# Altium footprint library ref-packages-longpad.PCBLIB: 1527 footprints (part 73 of 103)
Each footprint in its own frame and in the unit in brackets; x right, y up, seen from the top. Pads: shape width x height; smd on the part's side, far side on the other; paste and mask are expansions set on the pad; w line width, h text height; cw(c..) or ccw(c..) is an arc to the next point about the centre after c.
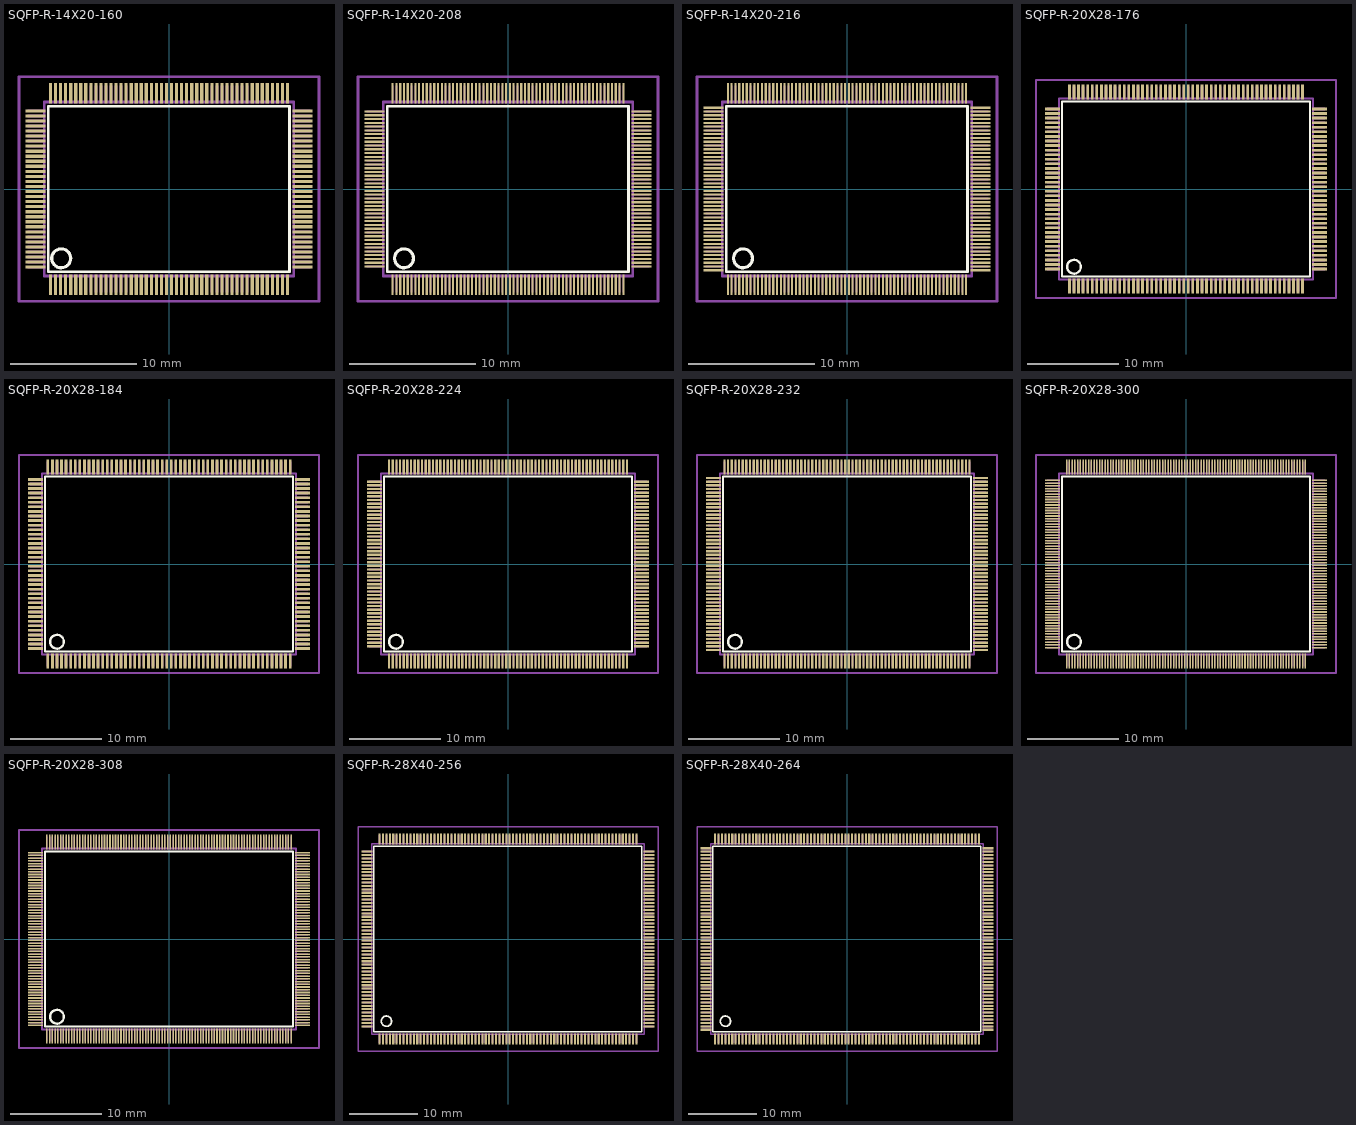
[diagram p72: the footprints below, top view; thin cyan lines are the x and y axes]

## SQFP-R-14X20-160 [mm]
pads (160):
  rect 0.25x1.6 smd: 1(-9.4,-7.6) 2(-9,-7.6) 3(-8.6,-7.6) 4(-8.2,-7.6) 5(-7.8,-7.6) 6(-7.4,-7.6) 7(-7,-7.6) 8(-6.6,-7.6) 9(-6.2,-7.6) 10(-5.8,-7.6) 11(-5.4,-7.6) 12(-5,-7.6) 13(-4.6,-7.6) 14(-4.2,-7.6) 15(-3.8,-7.6) 16(-3.4,-7.6) 17(-3,-7.6) 18(-2.6,-7.6) 19(-2.2,-7.6) 20(-1.8,-7.6) 21(-1.4,-7.6) 22(-1,-7.6) 23(-0.6,-7.6) 24(-0.2,-7.6) 25(0.2,-7.6) 26(0.6,-7.6) 27(1,-7.6) 28(1.4,-7.6) 29(1.8,-7.6) 30(2.2,-7.6) 31(2.6,-7.6) 32(3,-7.6) 33(3.4,-7.6) 34(3.8,-7.6) 35(4.2,-7.6) 36(4.6,-7.6) 37(5,-7.6) 38(5.4,-7.6) 39(5.8,-7.6) 40(6.2,-7.6) 41(6.6,-7.6) 42(7,-7.6) 43(7.4,-7.6) 44(7.8,-7.6) 45(8.2,-7.6) 46(8.6,-7.6) 47(9,-7.6) 48(9.4,-7.6) 81(9.4,7.6) 82(9,7.6) 83(8.6,7.6) 84(8.2,7.6) 85(7.8,7.6) 86(7.4,7.6) 87(7,7.6) 88(6.6,7.6) 89(6.2,7.6) 90(5.8,7.6) 91(5.4,7.6) 92(5,7.6) 93(4.6,7.6) 94(4.2,7.6) 95(3.8,7.6) 96(3.4,7.6) 97(3,7.6) 98(2.6,7.6) 99(2.2,7.6) 100(1.8,7.6) 101(1.4,7.6) 102(1,7.6) 103(0.6,7.6) 104(0.2,7.6) 105(-0.2,7.6) 106(-0.6,7.6) 107(-1,7.6) 108(-1.4,7.6) 109(-1.8,7.6) 110(-2.2,7.6) 111(-2.6,7.6) 112(-3,7.6) 113(-3.4,7.6) 114(-3.8,7.6) 115(-4.2,7.6) 116(-4.6,7.6) 117(-5,7.6) 118(-5.4,7.6) 119(-5.8,7.6) 120(-6.2,7.6) 121(-6.6,7.6) 122(-7,7.6) 123(-7.4,7.6) 124(-7.8,7.6) 125(-8.2,7.6) 126(-8.6,7.6) 127(-9,7.6) 128(-9.4,7.6)
  rect 1.6x0.25 smd: 49(10.6,-6.2) 50(10.6,-5.8) 51(10.6,-5.4) 52(10.6,-5) 53(10.6,-4.6) 54(10.6,-4.2) 55(10.6,-3.8) 56(10.6,-3.4) 57(10.6,-3) 58(10.6,-2.6) 59(10.6,-2.2) 60(10.6,-1.8) 61(10.6,-1.4) 62(10.6,-1) 63(10.6,-0.6) 64(10.6,-0.2) 65(10.6,0.2) 66(10.6,0.6) 67(10.6,1) 68(10.6,1.4) 69(10.6,1.8) 70(10.6,2.2) 71(10.6,2.6) 72(10.6,3) 73(10.6,3.4) 74(10.6,3.8) 75(10.6,4.2) 76(10.6,4.6) 77(10.6,5) 78(10.6,5.4) 79(10.6,5.8) 80(10.6,6.2) 129(-10.6,6.2) 130(-10.6,5.8) 131(-10.6,5.4) 132(-10.6,5) 133(-10.6,4.6) 134(-10.6,4.2) 135(-10.6,3.8) 136(-10.6,3.4) 137(-10.6,3) 138(-10.6,2.6) 139(-10.6,2.2) 140(-10.6,1.8) 141(-10.6,1.4) 142(-10.6,1) 143(-10.6,0.6) 144(-10.6,0.2) 145(-10.6,-0.2) 146(-10.6,-0.6) 147(-10.6,-1) 148(-10.6,-1.4) 149(-10.6,-1.8) 150(-10.6,-2.2) 151(-10.6,-2.6) 152(-10.6,-3) 153(-10.6,-3.4) 154(-10.6,-3.8) 155(-10.6,-4.2) 156(-10.6,-4.6) 157(-10.6,-5) 158(-10.6,-5.4) 159(-10.6,-5.8) 160(-10.6,-6.2)
Top Overlay:
  circle w0.254: c-8.55,-5.5 r0.75
  lines w0.203: -9.57,-6.56 9.56,-6.56 9.56,6.56 -9.57,6.56 -9.57,-6.56
Mechanical 16:
  drawing of 164 lines, arcs and shapes, not listed
Mechanical 27:
  lines w0.2: -11.9,-8.9 -11.9,8.9 11.9,8.9 11.9,-8.9 -11.9,-8.9

## SQFP-R-14X20-208 [mm]
pads (208):
  rect 0.17x1.6 smd: 1(-9.15,-7.6) 2(-8.85,-7.6) 3(-8.55,-7.6) 4(-8.25,-7.6) 5(-7.95,-7.6) 6(-7.65,-7.6) 7(-7.35,-7.6) 8(-7.05,-7.6) 9(-6.75,-7.6) 10(-6.45,-7.6) 11(-6.15,-7.6) 12(-5.85,-7.6) 13(-5.55,-7.6) 14(-5.25,-7.6) 15(-4.95,-7.6) 16(-4.65,-7.6) 17(-4.35,-7.6) 18(-4.05,-7.6) 19(-3.75,-7.6) 20(-3.45,-7.6) 21(-3.15,-7.6) 22(-2.85,-7.6) 23(-2.55,-7.6) 24(-2.25,-7.6) 25(-1.95,-7.6) 26(-1.65,-7.6) 27(-1.35,-7.6) 28(-1.05,-7.6) 29(-0.75,-7.6) 30(-0.45,-7.6) 31(-0.15,-7.6) 32(0.15,-7.6) 33(0.45,-7.6) 34(0.75,-7.6) 35(1.05,-7.6) 36(1.35,-7.6) 37(1.65,-7.6) 38(1.95,-7.6) 39(2.25,-7.6) 40(2.55,-7.6) 41(2.85,-7.6) 42(3.15,-7.6) 43(3.45,-7.6) 44(3.75,-7.6) 45(4.05,-7.6) 46(4.35,-7.6) 47(4.65,-7.6) 48(4.95,-7.6) 49(5.25,-7.6) 50(5.55,-7.6) 51(5.85,-7.6) 52(6.15,-7.6) 53(6.45,-7.6) 54(6.75,-7.6) 55(7.05,-7.6) 56(7.35,-7.6) 57(7.65,-7.6) 58(7.95,-7.6) 59(8.25,-7.6) 60(8.55,-7.6) 61(8.85,-7.6) 62(9.15,-7.6) 105(9.15,7.6) 106(8.85,7.6) 107(8.55,7.6) 108(8.25,7.6) 109(7.95,7.6) 110(7.65,7.6) 111(7.35,7.6) 112(7.05,7.6) 113(6.75,7.6) 114(6.45,7.6) 115(6.15,7.6) 116(5.85,7.6) 117(5.55,7.6) 118(5.25,7.6) 119(4.95,7.6) 120(4.65,7.6) 121(4.35,7.6) 122(4.05,7.6) 123(3.75,7.6) 124(3.45,7.6) 125(3.15,7.6) 126(2.85,7.6) 127(2.55,7.6) 128(2.25,7.6) 129(1.95,7.6) 130(1.65,7.6) 131(1.35,7.6) 132(1.05,7.6) 133(0.75,7.6) 134(0.45,7.6) 135(0.15,7.6) 136(-0.15,7.6) 137(-0.45,7.6) 138(-0.75,7.6) 139(-1.05,7.6) 140(-1.35,7.6) 141(-1.65,7.6) 142(-1.95,7.6) 143(-2.25,7.6) 144(-2.55,7.6) 145(-2.85,7.6) 146(-3.15,7.6) 147(-3.45,7.6) 148(-3.75,7.6) 149(-4.05,7.6) 150(-4.35,7.6) 151(-4.65,7.6) 152(-4.95,7.6) 153(-5.25,7.6) 154(-5.55,7.6) 155(-5.85,7.6) 156(-6.15,7.6) 157(-6.45,7.6) 158(-6.75,7.6) 159(-7.05,7.6) 160(-7.35,7.6) 161(-7.65,7.6) 162(-7.95,7.6) 163(-8.25,7.6) 164(-8.55,7.6) 165(-8.85,7.6) 166(-9.15,7.6)
  rect 1.6x0.17 smd: 63(10.6,-6.15) 64(10.6,-5.85) 65(10.6,-5.55) 66(10.6,-5.25) 67(10.6,-4.95) 68(10.6,-4.65) 69(10.6,-4.35) 70(10.6,-4.05) 71(10.6,-3.75) 72(10.6,-3.45) 73(10.6,-3.15) 74(10.6,-2.85) 75(10.6,-2.55) 76(10.6,-2.25) 77(10.6,-1.95) 78(10.6,-1.65) 79(10.6,-1.35) 80(10.6,-1.05) 81(10.6,-0.75) 82(10.6,-0.45) 83(10.6,-0.15) 84(10.6,0.15) 85(10.6,0.45) 86(10.6,0.75) 87(10.6,1.05) 88(10.6,1.35) 89(10.6,1.65) 90(10.6,1.95) 91(10.6,2.25) 92(10.6,2.55) 93(10.6,2.85) 94(10.6,3.15) 95(10.6,3.45) 96(10.6,3.75) 97(10.6,4.05) 98(10.6,4.35) 99(10.6,4.65) 100(10.6,4.95) 101(10.6,5.25) 102(10.6,5.55) 103(10.6,5.85) 104(10.6,6.15) 167(-10.6,6.15) 168(-10.6,5.85) 169(-10.6,5.55) 170(-10.6,5.25) 171(-10.6,4.95) 172(-10.6,4.65) 173(-10.6,4.35) 174(-10.6,4.05) 175(-10.6,3.75) 176(-10.6,3.45) 177(-10.6,3.15) 178(-10.6,2.85) 179(-10.6,2.55) 180(-10.6,2.25) 181(-10.6,1.95) 182(-10.6,1.65) 183(-10.6,1.35) 184(-10.6,1.05) 185(-10.6,0.75) 186(-10.6,0.45) 187(-10.6,0.15) 188(-10.6,-0.15) 189(-10.6,-0.45) 190(-10.6,-0.75) 191(-10.6,-1.05) 192(-10.6,-1.35) 193(-10.6,-1.65) 194(-10.6,-1.95) 195(-10.6,-2.25) 196(-10.6,-2.55) 197(-10.6,-2.85) 198(-10.6,-3.15) 199(-10.6,-3.45) 200(-10.6,-3.75) 201(-10.6,-4.05) 202(-10.6,-4.35) 203(-10.6,-4.65) 204(-10.6,-4.95) 205(-10.6,-5.25) 206(-10.6,-5.55) 207(-10.6,-5.85) 208(-10.6,-6.15)
Top Overlay:
  circle w0.254: c-8.25,-5.5 r0.75
  lines w0.203: -9.57,-6.56 9.56,-6.56 9.56,6.56 -9.57,6.56 -9.57,-6.56
Mechanical 16:
  drawing of 212 lines, arcs and shapes, not listed
Mechanical 27:
  lines w0.2: -11.9,-8.9 -11.9,8.9 11.9,8.9 11.9,-8.9 -11.9,-8.9

## SQFP-R-14X20-216 [mm]
pads (216):
  rect 0.17x1.6 smd: 1(-9.45,-7.6) 2(-9.15,-7.6) 3(-8.85,-7.6) 4(-8.55,-7.6) 5(-8.25,-7.6) 6(-7.95,-7.6) 7(-7.65,-7.6) 8(-7.35,-7.6) 9(-7.05,-7.6) 10(-6.75,-7.6) 11(-6.45,-7.6) 12(-6.15,-7.6) 13(-5.85,-7.6) 14(-5.55,-7.6) 15(-5.25,-7.6) 16(-4.95,-7.6) 17(-4.65,-7.6) 18(-4.35,-7.6) 19(-4.05,-7.6) 20(-3.75,-7.6) 21(-3.45,-7.6) 22(-3.15,-7.6) 23(-2.85,-7.6) 24(-2.55,-7.6) 25(-2.25,-7.6) 26(-1.95,-7.6) 27(-1.65,-7.6) 28(-1.35,-7.6) 29(-1.05,-7.6) 30(-0.75,-7.6) 31(-0.45,-7.6) 32(-0.15,-7.6) 33(0.15,-7.6) 34(0.45,-7.6) 35(0.75,-7.6) 36(1.05,-7.6) 37(1.35,-7.6) 38(1.65,-7.6) 39(1.95,-7.6) 40(2.25,-7.6) 41(2.55,-7.6) 42(2.85,-7.6) 43(3.15,-7.6) 44(3.45,-7.6) 45(3.75,-7.6) 46(4.05,-7.6) 47(4.35,-7.6) 48(4.65,-7.6) 49(4.95,-7.6) 50(5.25,-7.6) 51(5.55,-7.6) 52(5.85,-7.6) 53(6.15,-7.6) 54(6.45,-7.6) 55(6.75,-7.6) 56(7.05,-7.6) 57(7.35,-7.6) 58(7.65,-7.6) 59(7.95,-7.6) 60(8.25,-7.6) 61(8.55,-7.6) 62(8.85,-7.6) 63(9.15,-7.6) 64(9.45,-7.6) 109(9.45,7.6) 110(9.15,7.6) 111(8.85,7.6) 112(8.55,7.6) 113(8.25,7.6) 114(7.95,7.6) 115(7.65,7.6) 116(7.35,7.6) 117(7.05,7.6) 118(6.75,7.6) 119(6.45,7.6) 120(6.15,7.6) 121(5.85,7.6) 122(5.55,7.6) 123(5.25,7.6) 124(4.95,7.6) 125(4.65,7.6) 126(4.35,7.6) 127(4.05,7.6) 128(3.75,7.6) 129(3.45,7.6) 130(3.15,7.6) 131(2.85,7.6) 132(2.55,7.6) 133(2.25,7.6) 134(1.95,7.6) 135(1.65,7.6) 136(1.35,7.6) 137(1.05,7.6) 138(0.75,7.6) 139(0.45,7.6) 140(0.15,7.6) 141(-0.15,7.6) 142(-0.45,7.6) 143(-0.75,7.6) 144(-1.05,7.6) 145(-1.35,7.6) 146(-1.65,7.6) 147(-1.95,7.6) 148(-2.25,7.6) 149(-2.55,7.6) 150(-2.85,7.6) 151(-3.15,7.6) 152(-3.45,7.6) 153(-3.75,7.6) 154(-4.05,7.6) 155(-4.35,7.6) 156(-4.65,7.6) 157(-4.95,7.6) 158(-5.25,7.6) 159(-5.55,7.6) 160(-5.85,7.6) 161(-6.15,7.6) 162(-6.45,7.6) 163(-6.75,7.6) 164(-7.05,7.6) 165(-7.35,7.6) 166(-7.65,7.6) 167(-7.95,7.6) 168(-8.25,7.6) 169(-8.55,7.6) 170(-8.85,7.6) 171(-9.15,7.6) 172(-9.45,7.6)
  rect 1.6x0.17 smd: 65(10.6,-6.45) 66(10.6,-6.15) 67(10.6,-5.85) 68(10.6,-5.55) 69(10.6,-5.25) 70(10.6,-4.95) 71(10.6,-4.65) 72(10.6,-4.35) 73(10.6,-4.05) 74(10.6,-3.75) 75(10.6,-3.45) 76(10.6,-3.15) 77(10.6,-2.85) 78(10.6,-2.55) 79(10.6,-2.25) 80(10.6,-1.95) 81(10.6,-1.65) 82(10.6,-1.35) 83(10.6,-1.05) 84(10.6,-0.75) 85(10.6,-0.45) 86(10.6,-0.15) 87(10.6,0.15) 88(10.6,0.45) 89(10.6,0.75) 90(10.6,1.05) 91(10.6,1.35) 92(10.6,1.65) 93(10.6,1.95) 94(10.6,2.25) 95(10.6,2.55) 96(10.6,2.85) 97(10.6,3.15) 98(10.6,3.45) 99(10.6,3.75) 100(10.6,4.05) 101(10.6,4.35) 102(10.6,4.65) 103(10.6,4.95) 104(10.6,5.25) 105(10.6,5.55) 106(10.6,5.85) 107(10.6,6.15) 108(10.6,6.45) 173(-10.6,6.45) 174(-10.6,6.15) 175(-10.6,5.85) 176(-10.6,5.55) 177(-10.6,5.25) 178(-10.6,4.95) 179(-10.6,4.65) 180(-10.6,4.35) 181(-10.6,4.05) 182(-10.6,3.75) 183(-10.6,3.45) 184(-10.6,3.15) 185(-10.6,2.85) 186(-10.6,2.55) 187(-10.6,2.25) 188(-10.6,1.95) 189(-10.6,1.65) 190(-10.6,1.35) 191(-10.6,1.05) 192(-10.6,0.75) 193(-10.6,0.45) 194(-10.6,0.15) 195(-10.6,-0.15) 196(-10.6,-0.45) 197(-10.6,-0.75) 198(-10.6,-1.05) 199(-10.6,-1.35) 200(-10.6,-1.65) 201(-10.6,-1.95) 202(-10.6,-2.25) 203(-10.6,-2.55) 204(-10.6,-2.85) 205(-10.6,-3.15) 206(-10.6,-3.45) 207(-10.6,-3.75) 208(-10.6,-4.05) 209(-10.6,-4.35) 210(-10.6,-4.65) 211(-10.6,-4.95) 212(-10.6,-5.25) 213(-10.6,-5.55) 214(-10.6,-5.85) 215(-10.6,-6.15) 216(-10.6,-6.45)
Top Overlay:
  circle w0.254: c-8.25,-5.5 r0.75
  lines w0.203: -9.57,-6.56 9.56,-6.56 9.56,6.56 -9.57,6.56 -9.57,-6.56
Mechanical 16:
  drawing of 220 lines, arcs and shapes, not listed
Mechanical 27:
  lines w0.2: -11.9,-8.9 -11.9,8.9 11.9,8.9 11.9,-8.9 -11.9,-8.9

## SQFP-R-20X28-176 [mil]
pads (176):
  rect 11.81x62.99 smd: 1(-501.97,-417.32) 2(-482.28,-417.32) 3(-462.6,-417.32) 4(-442.91,-417.32) 5(-423.23,-417.32) 6(-403.54,-417.32) 7(-383.86,-417.32) 8(-364.17,-417.32) 9(-344.49,-417.32) 10(-324.8,-417.32) 11(-305.12,-417.32) 12(-285.43,-417.32) 13(-265.75,-417.32) 14(-246.06,-417.32) 15(-226.38,-417.32) 16(-206.69,-417.32) 17(-187.01,-417.32) 18(-167.32,-417.32) 19(-147.64,-417.32) 20(-127.95,-417.32) 21(-108.27,-417.32) 22(-88.58,-417.32) 23(-68.9,-417.32) 24(-49.21,-417.32) 25(-29.53,-417.32) 26(-9.84,-417.32) 27(9.84,-417.32) 28(29.53,-417.32) 29(49.21,-417.32) 30(68.9,-417.32) 31(88.58,-417.32) 32(108.27,-417.32) 33(127.95,-417.32) 34(147.64,-417.32) 35(167.32,-417.32) 36(187.01,-417.32) 37(206.69,-417.32) 38(226.38,-417.32) 39(246.06,-417.32) 40(265.75,-417.32) 41(285.43,-417.32) 42(305.12,-417.32) 43(324.8,-417.32) 44(344.49,-417.32) 45(364.17,-417.32) 46(383.86,-417.32) 47(403.54,-417.32) 48(423.23,-417.32) 49(442.91,-417.32) 50(462.6,-417.32) 51(482.28,-417.32) 52(501.97,-417.32) 89(501.97,417.32) 90(482.28,417.32) 91(462.6,417.32) 92(442.91,417.32) 93(423.23,417.32) 94(403.54,417.32) 95(383.86,417.32) 96(364.17,417.32) 97(344.49,417.32) 98(324.8,417.32) 99(305.12,417.32) 100(285.43,417.32) 101(265.75,417.32) 102(246.06,417.32) 103(226.38,417.32) 104(206.69,417.32) 105(187.01,417.32) 106(167.32,417.32) 107(147.64,417.32) 108(127.95,417.32) 109(108.27,417.32) 110(88.58,417.32) 111(68.9,417.32) 112(49.21,417.32) 113(29.53,417.32) 114(9.84,417.32) 115(-9.84,417.32) 116(-29.53,417.32) 117(-49.21,417.32) 118(-68.9,417.32) 119(-88.58,417.32) 120(-108.27,417.32) 121(-127.95,417.32) 122(-147.64,417.32) 123(-167.32,417.32) 124(-187.01,417.32) 125(-206.69,417.32) 126(-226.38,417.32) 127(-246.06,417.32) 128(-265.75,417.32) 129(-285.43,417.32) 130(-305.12,417.32) 131(-324.8,417.32) 132(-344.49,417.32) 133(-364.17,417.32) 134(-383.86,417.32) 135(-403.54,417.32) 136(-423.23,417.32) 137(-442.91,417.32) 138(-462.6,417.32) 139(-482.28,417.32) 140(-501.97,417.32)
  rect 62.99x11.81 smd: 53(574.8,-344.49) 54(574.8,-324.8) 55(574.8,-305.12) 56(574.8,-285.43) 57(574.8,-265.75) 58(574.8,-246.06) 59(574.8,-226.38) 60(574.8,-206.69) 61(574.8,-187.01) 62(574.8,-167.32) 63(574.8,-147.64) 64(574.8,-127.95) 65(574.8,-108.27) 66(574.8,-88.58) 67(574.8,-68.9) 68(574.8,-49.21) 69(574.8,-29.53) 70(574.8,-9.84) 71(574.8,9.84) 72(574.8,29.53) 73(574.8,49.21) 74(574.8,68.9) 75(574.8,88.58) 76(574.8,108.27) 77(574.8,127.95) 78(574.8,147.64) 79(574.8,167.32) 80(574.8,187.01) 81(574.8,206.69) 82(574.8,226.38) 83(574.8,246.06) 84(574.8,265.75) 85(574.8,285.43) 86(574.8,305.12) 87(574.8,324.8) 88(574.8,344.49) 141(-574.8,344.49) 142(-574.8,324.8) 143(-574.8,305.12) 144(-574.8,285.43) 145(-574.8,265.75) 146(-574.8,246.06) 147(-574.8,226.38) 148(-574.8,206.69) 149(-574.8,187.01) 150(-574.8,167.32) 151(-574.8,147.64) 152(-574.8,127.95) 153(-574.8,108.27) 154(-574.8,88.58) 155(-574.8,68.9) 156(-574.8,49.21) 157(-574.8,29.53) 158(-574.8,9.84) 159(-574.8,-9.84) 160(-574.8,-29.53) 161(-574.8,-49.21) 162(-574.8,-68.9) 163(-574.8,-88.58) 164(-574.8,-108.27) 165(-574.8,-127.95) 166(-574.8,-147.64) 167(-574.8,-167.32) 168(-574.8,-187.01) 169(-574.8,-206.69) 170(-574.8,-226.38) 171(-574.8,-246.06) 172(-574.8,-265.75) 173(-574.8,-285.43) 174(-574.8,-305.12) 175(-574.8,-324.8) 176(-574.8,-344.49)
Top Overlay:
  circle w10: c-482.28,-334.65 r29.52
  lines w8: -534.25,-376.38 533.86,-376.38 533.86,376.38 -534.25,376.38 -534.25,-376.38
Mechanical 16:
  drawing of 180 lines, arcs and shapes, not listed
Mechanical 27:
  lines w7.87: -645.67,-468.5 -645.67,468.5 645.67,468.5 645.67,-468.5 -645.67,-468.5

## SQFP-R-20X28-184 [mil]
pads (184):
  rect 11.81x62.99 smd: 1(-521.65,-417.32) 2(-501.97,-417.32) 3(-482.28,-417.32) 4(-462.6,-417.32) 5(-442.91,-417.32) 6(-423.23,-417.32) 7(-403.54,-417.32) 8(-383.86,-417.32) 9(-364.17,-417.32) 10(-344.49,-417.32) 11(-324.8,-417.32) 12(-305.12,-417.32) 13(-285.43,-417.32) 14(-265.75,-417.32) 15(-246.06,-417.32) 16(-226.38,-417.32) 17(-206.69,-417.32) 18(-187.01,-417.32) 19(-167.32,-417.32) 20(-147.64,-417.32) 21(-127.95,-417.32) 22(-108.27,-417.32) 23(-88.58,-417.32) 24(-68.9,-417.32) 25(-49.21,-417.32) 26(-29.53,-417.32) 27(-9.84,-417.32) 28(9.84,-417.32) 29(29.53,-417.32) 30(49.21,-417.32) 31(68.9,-417.32) 32(88.58,-417.32) 33(108.27,-417.32) 34(127.95,-417.32) 35(147.64,-417.32) 36(167.32,-417.32) 37(187.01,-417.32) 38(206.69,-417.32) 39(226.38,-417.32) 40(246.06,-417.32) 41(265.75,-417.32) 42(285.43,-417.32) 43(305.12,-417.32) 44(324.8,-417.32) 45(344.49,-417.32) 46(364.17,-417.32) 47(383.86,-417.32) 48(403.54,-417.32) 49(423.23,-417.32) 50(442.91,-417.32) 51(462.6,-417.32) 52(482.28,-417.32) 53(501.97,-417.32) 54(521.65,-417.32) 93(521.65,417.32) 94(501.97,417.32) 95(482.28,417.32) 96(462.6,417.32) 97(442.91,417.32) 98(423.23,417.32) 99(403.54,417.32) 100(383.86,417.32) 101(364.17,417.32) 102(344.49,417.32) 103(324.8,417.32) 104(305.12,417.32) 105(285.43,417.32) 106(265.75,417.32) 107(246.06,417.32) 108(226.38,417.32) 109(206.69,417.32) 110(187.01,417.32) 111(167.32,417.32) 112(147.64,417.32) 113(127.95,417.32) 114(108.27,417.32) 115(88.58,417.32) 116(68.9,417.32) 117(49.21,417.32) 118(29.53,417.32) 119(9.84,417.32) 120(-9.84,417.32) 121(-29.53,417.32) 122(-49.21,417.32) 123(-68.9,417.32) 124(-88.58,417.32) 125(-108.27,417.32) 126(-127.95,417.32) 127(-147.64,417.32) 128(-167.32,417.32) 129(-187.01,417.32) 130(-206.69,417.32) 131(-226.38,417.32) 132(-246.06,417.32) 133(-265.75,417.32) 134(-285.43,417.32) 135(-305.12,417.32) 136(-324.8,417.32) 137(-344.49,417.32) 138(-364.17,417.32) 139(-383.86,417.32) 140(-403.54,417.32) 141(-423.23,417.32) 142(-442.91,417.32) 143(-462.6,417.32) 144(-482.28,417.32) 145(-501.97,417.32) 146(-521.65,417.32)
  rect 62.99x11.81 smd: 55(574.8,-364.17) 56(574.8,-344.49) 57(574.8,-324.8) 58(574.8,-305.12) 59(574.8,-285.43) 60(574.8,-265.75) 61(574.8,-246.06) 62(574.8,-226.38) 63(574.8,-206.69) 64(574.8,-187.01) 65(574.8,-167.32) 66(574.8,-147.64) 67(574.8,-127.95) 68(574.8,-108.27) 69(574.8,-88.58) 70(574.8,-68.9) 71(574.8,-49.21) 72(574.8,-29.53) 73(574.8,-9.84) 74(574.8,9.84) 75(574.8,29.53) 76(574.8,49.21) 77(574.8,68.9) 78(574.8,88.58) 79(574.8,108.27) 80(574.8,127.95) 81(574.8,147.64) 82(574.8,167.32) 83(574.8,187.01) 84(574.8,206.69) 85(574.8,226.38) 86(574.8,246.06) 87(574.8,265.75) 88(574.8,285.43) 89(574.8,305.12) 90(574.8,324.8) 91(574.8,344.49) 92(574.8,364.17) 147(-574.8,364.17) 148(-574.8,344.49) 149(-574.8,324.8) 150(-574.8,305.12) 151(-574.8,285.43) 152(-574.8,265.75) 153(-574.8,246.06) 154(-574.8,226.38) 155(-574.8,206.69) 156(-574.8,187.01) 157(-574.8,167.32) 158(-574.8,147.64) 159(-574.8,127.95) 160(-574.8,108.27) 161(-574.8,88.58) 162(-574.8,68.9) 163(-574.8,49.21) 164(-574.8,29.53) 165(-574.8,9.84) 166(-574.8,-9.84) 167(-574.8,-29.53) 168(-574.8,-49.21) 169(-574.8,-68.9) 170(-574.8,-88.58) 171(-574.8,-108.27) 172(-574.8,-127.95) 173(-574.8,-147.64) 174(-574.8,-167.32) 175(-574.8,-187.01) 176(-574.8,-206.69) 177(-574.8,-226.38) 178(-574.8,-246.06) 179(-574.8,-265.75) 180(-574.8,-285.43) 181(-574.8,-305.12) 182(-574.8,-324.8) 183(-574.8,-344.49) 184(-574.8,-364.17)
Top Overlay:
  circle w10: c-482.28,-334.65 r29.52
  lines w8: -534.25,-376.38 533.86,-376.38 533.86,376.38 -534.25,376.38 -534.25,-376.38
Mechanical 16:
  drawing of 188 lines, arcs and shapes, not listed
Mechanical 27:
  lines w7.87: -645.67,-468.5 -645.67,468.5 645.67,468.5 645.67,-468.5 -645.67,-468.5

## SQFP-R-20X28-224 [mm]
pads (224):
  rect 0.25x1.6 smd: 1(-13,-10.6) 2(-12.6,-10.6) 3(-12.2,-10.6) 4(-11.8,-10.6) 5(-11.4,-10.6) 6(-11,-10.6) 7(-10.6,-10.6) 8(-10.2,-10.6) 9(-9.8,-10.6) 10(-9.4,-10.6) 11(-9,-10.6) 12(-8.6,-10.6) 13(-8.2,-10.6) 14(-7.8,-10.6) 15(-7.4,-10.6) 16(-7,-10.6) 17(-6.6,-10.6) 18(-6.2,-10.6) 19(-5.8,-10.6) 20(-5.4,-10.6) 21(-5,-10.6) 22(-4.6,-10.6) 23(-4.2,-10.6) 24(-3.8,-10.6) 25(-3.4,-10.6) 26(-3,-10.6) 27(-2.6,-10.6) 28(-2.2,-10.6) 29(-1.8,-10.6) 30(-1.4,-10.6) 31(-1,-10.6) 32(-0.6,-10.6) 33(-0.2,-10.6) 34(0.2,-10.6) 35(0.6,-10.6) 36(1,-10.6) 37(1.4,-10.6) 38(1.8,-10.6) 39(2.2,-10.6) 40(2.6,-10.6) 41(3,-10.6) 42(3.4,-10.6) 43(3.8,-10.6) 44(4.2,-10.6) 45(4.6,-10.6) 46(5,-10.6) 47(5.4,-10.6) 48(5.8,-10.6) 49(6.2,-10.6) 50(6.6,-10.6) 51(7,-10.6) 52(7.4,-10.6) 53(7.8,-10.6) 54(8.2,-10.6) 55(8.6,-10.6) 56(9,-10.6) 57(9.4,-10.6) 58(9.8,-10.6) 59(10.2,-10.6) 60(10.6,-10.6) 61(11,-10.6) 62(11.4,-10.6) 63(11.8,-10.6) 64(12.2,-10.6) 65(12.6,-10.6) 66(13,-10.6) 113(13,10.6) 114(12.6,10.6) 115(12.2,10.6) 116(11.8,10.6) 117(11.4,10.6) 118(11,10.6) 119(10.6,10.6) 120(10.2,10.6) 121(9.8,10.6) 122(9.4,10.6) 123(9,10.6) 124(8.6,10.6) 125(8.2,10.6) 126(7.8,10.6) 127(7.4,10.6) 128(7,10.6) 129(6.6,10.6) 130(6.2,10.6) 131(5.8,10.6) 132(5.4,10.6) 133(5,10.6) 134(4.6,10.6) 135(4.2,10.6) 136(3.8,10.6) 137(3.4,10.6) 138(3,10.6) 139(2.6,10.6) 140(2.2,10.6) 141(1.8,10.6) 142(1.4,10.6) 143(1,10.6) 144(0.6,10.6) 145(0.2,10.6) 146(-0.2,10.6) 147(-0.6,10.6) 148(-1,10.6) 149(-1.4,10.6) 150(-1.8,10.6) 151(-2.2,10.6) 152(-2.6,10.6) 153(-3,10.6) 154(-3.4,10.6) 155(-3.8,10.6) 156(-4.2,10.6) 157(-4.6,10.6) 158(-5,10.6) 159(-5.4,10.6) 160(-5.8,10.6) 161(-6.2,10.6) 162(-6.6,10.6) 163(-7,10.6) 164(-7.4,10.6) 165(-7.8,10.6) 166(-8.2,10.6) 167(-8.6,10.6) 168(-9,10.6) 169(-9.4,10.6) 170(-9.8,10.6) 171(-10.2,10.6) 172(-10.6,10.6) 173(-11,10.6) 174(-11.4,10.6) 175(-11.8,10.6) 176(-12.2,10.6) 177(-12.6,10.6) 178(-13,10.6)
  rect 1.6x0.25 smd: 67(14.6,-9) 68(14.6,-8.6) 69(14.6,-8.2) 70(14.6,-7.8) 71(14.6,-7.4) 72(14.6,-7) 73(14.6,-6.6) 74(14.6,-6.2) 75(14.6,-5.8) 76(14.6,-5.4) 77(14.6,-5) 78(14.6,-4.6) 79(14.6,-4.2) 80(14.6,-3.8) 81(14.6,-3.4) 82(14.6,-3) 83(14.6,-2.6) 84(14.6,-2.2) 85(14.6,-1.8) 86(14.6,-1.4) 87(14.6,-1) 88(14.6,-0.6) 89(14.6,-0.2) 90(14.6,0.2) 91(14.6,0.6) 92(14.6,1) 93(14.6,1.4) 94(14.6,1.8) 95(14.6,2.2) 96(14.6,2.6) 97(14.6,3) 98(14.6,3.4) 99(14.6,3.8) 100(14.6,4.2) 101(14.6,4.6) 102(14.6,5) 103(14.6,5.4) 104(14.6,5.8) 105(14.6,6.2) 106(14.6,6.6) 107(14.6,7) 108(14.6,7.4) 109(14.6,7.8) 110(14.6,8.2) 111(14.6,8.6) 112(14.6,9) 179(-14.6,9) 180(-14.6,8.6) 181(-14.6,8.2) 182(-14.6,7.8) 183(-14.6,7.4) 184(-14.6,7) 185(-14.6,6.6) 186(-14.6,6.2) 187(-14.6,5.8) 188(-14.6,5.4) 189(-14.6,5) 190(-14.6,4.6) 191(-14.6,4.2) 192(-14.6,3.8) 193(-14.6,3.4) 194(-14.6,3) 195(-14.6,2.6) 196(-14.6,2.2) 197(-14.6,1.8) 198(-14.6,1.4) 199(-14.6,1) 200(-14.6,0.6) 201(-14.6,0.2) 202(-14.6,-0.2) 203(-14.6,-0.6) 204(-14.6,-1) 205(-14.6,-1.4) 206(-14.6,-1.8) 207(-14.6,-2.2) 208(-14.6,-2.6) 209(-14.6,-3) 210(-14.6,-3.4) 211(-14.6,-3.8) 212(-14.6,-4.2) 213(-14.6,-4.6) 214(-14.6,-5) 215(-14.6,-5.4) 216(-14.6,-5.8) 217(-14.6,-6.2) 218(-14.6,-6.6) 219(-14.6,-7) 220(-14.6,-7.4) 221(-14.6,-7.8) 222(-14.6,-8.2) 223(-14.6,-8.6) 224(-14.6,-9)
Top Overlay:
  circle w0.254: c-12.25,-8.5 r0.75
  lines w0.203: -13.57,-9.56 13.56,-9.56 13.56,9.56 -13.57,9.56 -13.57,-9.56
Mechanical 16:
  drawing of 228 lines, arcs and shapes, not listed
Mechanical 27:
  lines w0.2: -16.4,-11.9 -16.4,11.9 16.4,11.9 16.4,-11.9 -16.4,-11.9
